# Altium footprint library ic.PcbLib: 129 footprints (part 4 of 9)
Each footprint in its own frame and in the unit in brackets; x right, y up, seen from the top. Pads: shape width x height; smd on the part's side, far side on the other; paste and mask are expansions set on the pad; w line width, h text height; cw(c..) or ccw(c..) is an arc to the next point about the centre after c.
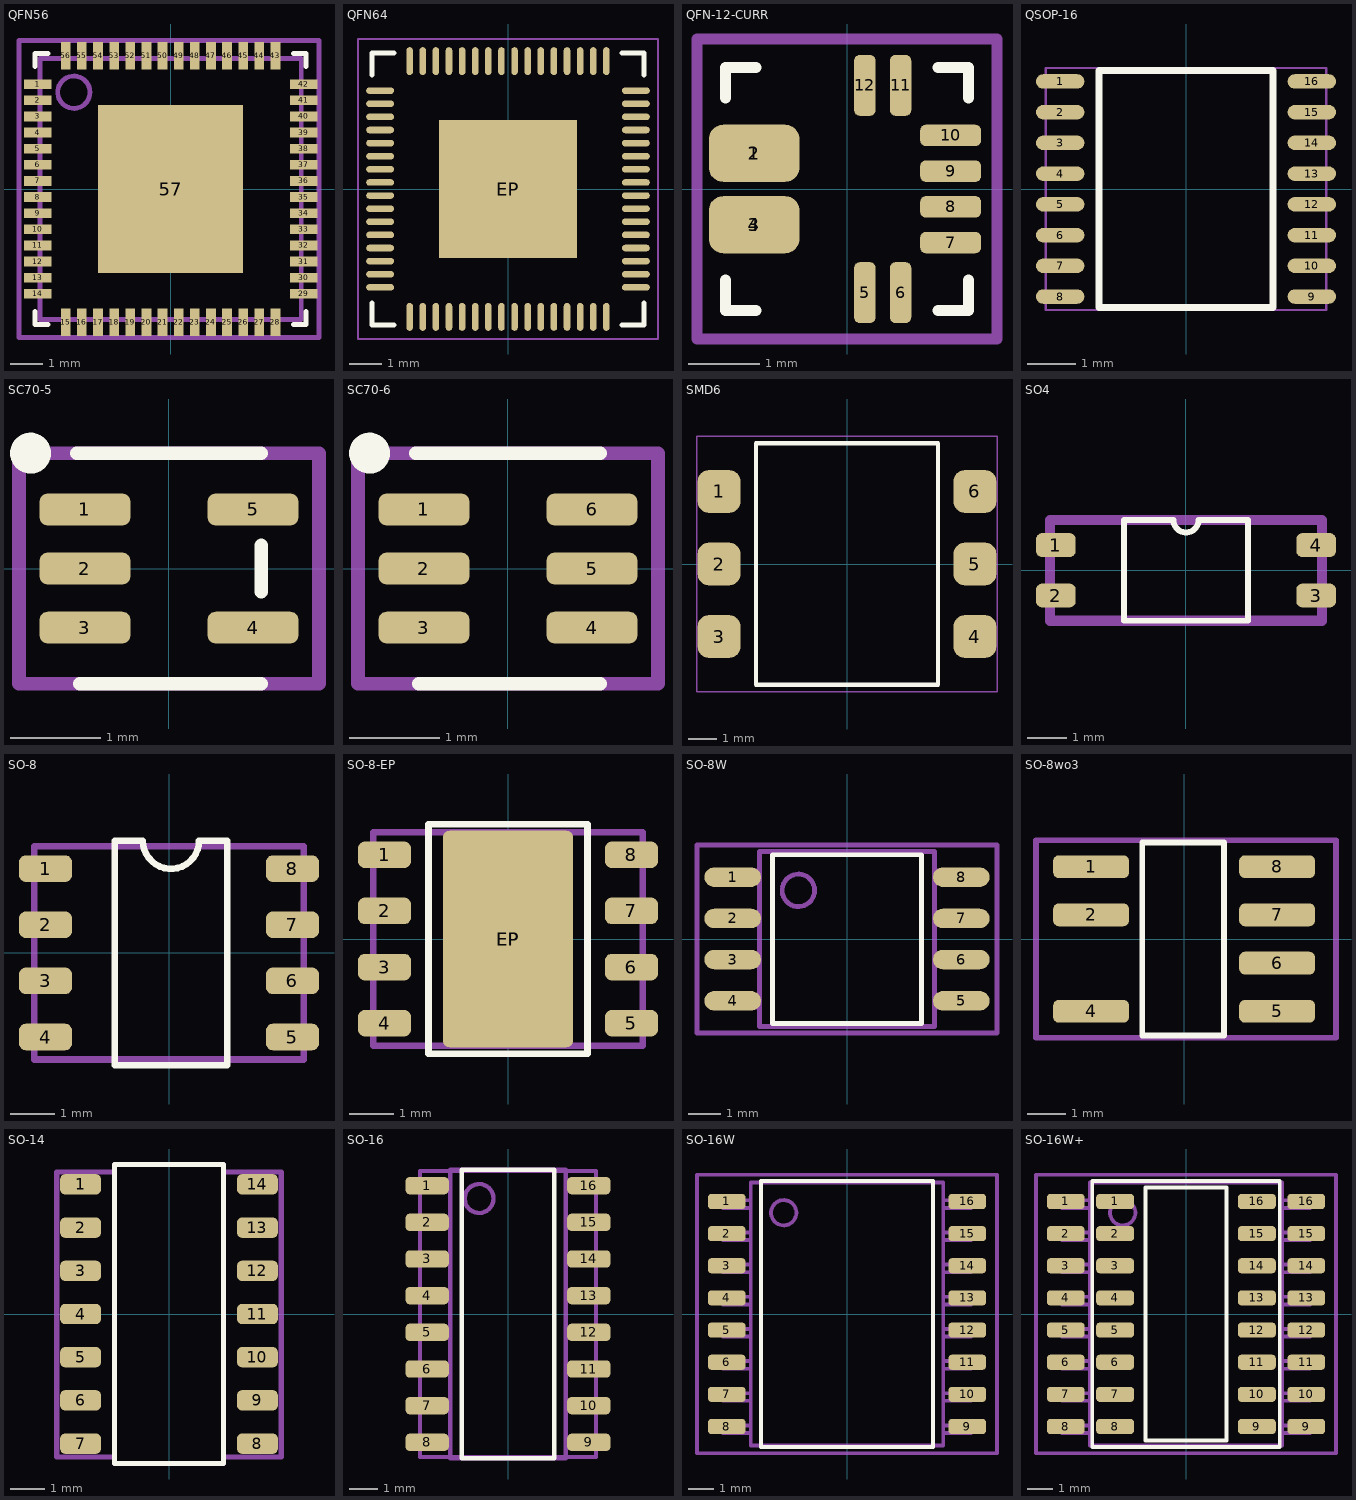
[diagram p3: the footprints below, top view; thin cyan lines are the x and y axes]

## QFN56 [mm] "QFN, 56-Leads, Body 8,00x8,00mm, Pitch 0,50mm, Thermal Pad 4,50x5,20mm, IPC Medium Density"
height 1
pads (57):
  rect 0.85x0.3 smd: 1(-4.125,3.25) 2(-4.125,2.75) 3(-4.125,2.25) 4(-4.125,1.75) 5(-4.125,1.25) 6(-4.125,0.75) 7(-4.125,0.25) 8(-4.125,-0.25) 9(-4.125,-0.75) 10(-4.125,-1.25) 11(-4.125,-1.75) 12(-4.125,-2.25) 13(-4.125,-2.75) 14(-4.125,-3.25) 29(4.125,-3.25) 30(4.125,-2.75) 31(4.125,-2.25) 32(4.125,-1.75) 33(4.125,-1.25) 34(4.125,-0.75) 35(4.125,-0.25) 36(4.125,0.25) 37(4.125,0.75) 38(4.125,1.25) 39(4.125,1.75) 40(4.125,2.25) 41(4.125,2.75) 42(4.125,3.25)
  rect 0.3x0.85 smd: 15(-3.25,-4.125) 16(-2.75,-4.125) 17(-2.25,-4.125) 18(-1.75,-4.125) 19(-1.25,-4.125) 20(-0.75,-4.125) 21(-0.25,-4.125) 22(0.25,-4.125) 23(0.75,-4.125) 24(1.25,-4.125) 25(1.75,-4.125) 26(2.25,-4.125) 27(2.75,-4.125) 28(3.25,-4.125) 43(3.25,4.125) 44(2.75,4.125) 45(2.25,4.125) 46(1.75,4.125) 47(1.25,4.125) 48(0.75,4.125) 49(0.25,4.125) 50(-0.25,4.125) 51(-0.75,4.125) 52(-1.25,4.125) 53(-1.75,4.125) 54(-2.25,4.125) 55(-2.75,4.125) 56(-3.25,4.125)
  rect 4.5x5.2 smd: 57(0,0)
Top Overlay:
  lines w0.15: -4.2,-3.8 -4.2,-4.2 -3.8,-4.2 ; -4.2,3.8 -4.2,4.2 -3.8,4.2 ; 3.8,-4.2 4.2,-4.2 4.2,-3.8 ; 3.8,4.2 4.2,4.2 4.2,3.8
  text "." at -4.761,3.935 h0.1
Top Courtyard:
  lines w0.15: -0.5,0 0.5,0 ; -4.7,-4.6 -4.7,4.6 4.6,4.6 4.6,-4.6 -4.7,-4.6
Mechanical 29:
  circle w0.15: c-3,3 r0.5
  lines w0.15: -4.05,-4.05 -4.05,4.05 4.05,4.05 4.05,-4.05 -4.05,-4.05
  text ".Designator" at -3.5,-0.4 h1

## QFN64 [mm] "QFN, 64-Leads, Body 8,00x8,00mm, Pitch 0,40mm, Thermal Pad 4,20x4,20mm, IPC Medium Density"
height 0.85
pads (65):
  oval 0.85x0.2 smd: 1(-3.9,3) 2(-3.9,2.6) 3(-3.9,2.2) 4(-3.9,1.8) 5(-3.9,1.4) 6(-3.9,1) 7(-3.9,0.6) 8(-3.9,0.2) 9(-3.9,-0.2) 10(-3.9,-0.6) 11(-3.9,-1) 12(-3.9,-1.4) 13(-3.9,-1.8) 14(-3.9,-2.2) 15(-3.9,-2.6) 16(-3.9,-3) 33(3.9,-3) 34(3.9,-2.6) 35(3.9,-2.2) 36(3.9,-1.8) 37(3.9,-1.4) 38(3.9,-1) 39(3.9,-0.6) 40(3.9,-0.2) 41(3.9,0.2) 42(3.9,0.6) 43(3.9,1) 44(3.9,1.4) 45(3.9,1.8) 46(3.9,2.2) 47(3.9,2.6) 48(3.9,3)
  oval 0.2x0.85 smd: 17(-3,-3.9) 18(-2.6,-3.9) 19(-2.2,-3.9) 20(-1.8,-3.9) 21(-1.4,-3.9) 22(-1,-3.9) 23(-0.6,-3.9) 24(-0.2,-3.9) 25(0.2,-3.9) 26(0.6,-3.9) 27(1,-3.9) 28(1.4,-3.9) 29(1.8,-3.9) 30(2.2,-3.9) 31(2.6,-3.9) 32(3,-3.9) 49(3,3.9) 50(2.6,3.9) 51(2.2,3.9) 52(1.8,3.9) 53(1.4,3.9) 54(1,3.9) 55(0.6,3.9) 56(0.2,3.9) 57(-0.2,3.9) 58(-0.6,3.9) 59(-1,3.9) 60(-1.4,3.9) 61(-1.8,3.9) 62(-2.2,3.9) 63(-2.6,3.9) 64(-3,3.9)
  rect 4.2x4.2 smd: EP(0,0)
Top Overlay:
  lines w0.15: -4.15,-3.475 -4.15,-4.15 -3.475,-4.15 ; -4.15,3.475 -4.15,4.15 -3.475,4.15 ; 3.475,-4.15 4.15,-4.15 4.15,-3.475 ; 3.475,4.15 4.15,4.15 4.15,3.475
  text "." at -4.9,3.9 h0.1
Top Courtyard:
  lines w0.05: -4.575,-4.575 4.575,-4.575 4.575,4.575 -4.575,4.575 -4.575,-4.575
  lines w0.1: -0.5,0 0.5,0 ; 0,-0.5 0,0.5
3D body "QFN64.step": height 0.85, standoff 0, extent -4.01,-4.01 4.01,4.01

## QFN-12-CURR [mm] "QFN, 12-Contact  With Fused Sensed Current Loop"
height 0.9
pads (12):
  rrect50% 1.27x0.8 smd: 1(-1.3,0.5) 2(-1.3,0.5) 3(-1.3,-0.5) 4(-1.3,-0.5)
  rrect50% 0.3x0.85 smd: 5(0.25,-1.45) 6(0.75,-1.45) 11(0.75,1.45) 12(0.25,1.45)
  rrect50% 0.85x0.3 smd: 7(1.45,-0.75) 8(1.45,-0.25) 9(1.45,0.25) 10(1.45,0.75)
Top Overlay:
  lines w0.15: -1.7,-1.275 -1.7,-1.7 -1.275,-1.7 ; -1.7,1.275 -1.7,1.7 -1.275,1.7 ; 1.275,-1.7 1.7,-1.7 1.7,-1.275 ; 1.275,1.7 1.7,1.7 1.7,1.275
  text "." at -2.2,1.575 h0.1
Top Courtyard:
  lines w0.15: -2.1,-2.1 -2.1,2.1 2.1,2.1 2.1,-2.1 -2.1,-2.1
3D body "QFN16.STEP": height 0.89, standoff 0, extent -1.55,-1.55 1.55,1.55

## QSOP-16 [mm] "QSOP, 16-Leads, Body 4,89x3,90mm, Pitch 0,64mm, IPC High Density"
height 1.75
pads (16):
  oval 1x0.3 smd: 1(-2.6,2.222) 2(-2.6,1.587) 3(-2.6,0.953) 4(-2.6,0.318) 5(-2.6,-0.318) 6(-2.6,-0.953) 7(-2.6,-1.587) 8(-2.6,-2.222) 9(2.6,-2.222) 10(2.6,-1.587) 11(2.6,-0.953) 12(2.6,-0.318) 13(2.6,0.318) 14(2.6,0.953) 15(2.6,1.587) 16(2.6,2.222)
Top Overlay:
  lines w0.15: -1.8,-2.45 -1.8,2.45 1.8,2.45 1.8,-2.45 -1.8,-2.45
  text "." at -2.655,2.859 h0.1
Top Courtyard:
  lines w0.05: -2.9,-2.5 -2.9,2.5 2.9,2.5 2.9,-2.5 -2.9,-2.5
3D body: height 1.75, standoff 0.2, extent 0,0 0,0
3D body: height 1, standoff 0.2, extent -2,-2.5 2,2.5

## SC70-5 [mm] "SOTFL, 5-Leads, Body 2,00x2,10mm, Pitch 1,30mm, IPC Medium Density"
height 1.1
pads (5):
  rrect50% 1x0.35 smd: 1(-0.925,0.65) 2(-0.925,0) 3(-0.925,-0.65) 4(0.925,-0.65) 5(0.925,0.65)
Top Overlay:
  circle w0.25: c-1.524,1.27 r0.1
  lines w0.15: -1.016,1.27 1.016,1.27 ; -0.984,-1.27 1.016,-1.27 ; 1.016,-0.254 1.016,0.254
Top Courtyard:
  lines w0.15: -1.651,-1.27 -1.651,1.27 1.651,1.27 1.651,-1.27 -1.651,-1.27
3D body: height 1.1, standoff 0, extent -1,-1.143 1,1.143

## SC70-6 [mm] "SOTFL, 6-Leads, Body 2,00x2,10mm, Pitch 1,30mm, IPC Medium Density"
height 1.1
pads (6):
  rrect50% 1x0.35 smd: 1(-0.925,0.65) 2(-0.925,0) 3(-0.925,-0.65) 4(0.925,-0.65) 5(0.925,0) 6(0.925,0.65)
Top Overlay:
  circle w0.25: c-1.524,1.27 r0.1
  lines w0.15: -1.016,1.27 1.016,1.27 ; -0.984,-1.27 1.016,-1.27
Top Courtyard:
  lines w0.15: -1.651,-1.27 -1.651,1.27 1.651,1.27 1.651,-1.27 -1.651,-1.27
3D body: height 1.1, standoff 0, extent -1,-1.143 1,1.143

## SMD6 [mm] "SMD-6, 6-Leads, Body 8,50x9,20mm, Pitch 2,55mm, IPC Medium Density"
height 4.8
pads (6):
  rrect50% 1.5x1.5 smd: 1(-4.5,2.55) 2(-4.5,0) 3(-4.5,-2.55) 4(4.5,-2.55) 5(4.5,0) 6(4.5,2.55)
Top Overlay:
  lines w0.15: -3.2,-4.25 -3.2,4.25 3.2,4.25 3.2,-4.25 -3.2,-4.25
  text "." at -4.65,4.135 h0.1
Top Courtyard:
  lines w0.05: -5.275,-4.5 5.275,-4.5 5.275,4.5 -5.275,4.5 -5.275,-4.5
3D body "SMD-6.step": height 4.8, standoff 0, extent -4.6,-4.25 4.6,4.25

## SO4 [mm]
pads (4):
  rrect50% 1x0.6 smd: 1(-3.277,0.635) 2(-3.277,-0.635) 3(3.277,-0.635) 4(3.277,0.635)
Top Overlay:
  lines w0.15: -1.565,-1.27 1.565,-1.27 1.565,1.27 0.318,1.27 cw(c0,1.27) -0.318,1.27 -1.565,1.27 -1.565,-1.27
  text "." at -3.15,1.435 h0.1
Top Courtyard:
  lines w0.254: -3.429,-1.27 -3.429,1.27 3.429,1.27 3.429,-1.27 -3.429,-1.27
3D body "PC3H7.STEP": height 2.1, standoff 0.05, extent -3.5,-1.3 3.5,1.3

## SO-8 [mm]
pads (8):
  rrect50% 1.2x0.6 smd: 1(-2.794,1.905) 2(-2.794,0.635) 3(-2.794,-0.635) 4(-2.794,-1.905) 5(2.794,-1.905) 6(2.794,-0.635) 7(2.794,0.635) 8(2.794,1.905)
Top Overlay:
  lines w0.15: -1.226,-2.545 1.314,-2.545 1.314,2.535 0.679,2.535 cw(c0.044,2.535) -0.591,2.535 -1.226,2.535 -1.226,-2.545
  text "." at -2.7,2.8 h0.1
Top Courtyard:
  lines w0.15: -3.048,-2.413 3.048,-2.413 3.048,2.413 -3.048,2.413 -3.048,-2.413
3D body "User Library-so8-4.STEP": height 1.76, standoff 0, extent -3.068,-2.445 3.068,2.445

## SO-8-EP [mm]
pads (10):
  rrect50% 1.2x0.6 smd: 1(-2.794,1.905) 2(-2.794,0.635) 3(-2.794,-0.635) 4(-2.794,-1.905) 5(2.794,-1.905) 6(2.794,-0.635) 7(2.794,0.635) 8(2.794,1.905)
  rrect10% 2.95x4.9 smd mask+0.102: EP(0,0)
  rrect10% 2.6x3.1 smd: EP(0,0)
Top Overlay:
  lines w0.15: 1.8,2.596 -1.8,2.596 -1.8,-2.6 1.8,-2.6 1.8,2.6
  text "." at -2.7,2.8 h0.1
Top Courtyard:
  lines w0.15: -3.048,-2.413 3.048,-2.413 3.048,2.413 -3.048,2.413 -3.048,-2.413
3D body "User Library-so8-4.STEP": height 1.76, standoff 0, extent -3.068,-2.445 3.068,2.445

## SO-8W [mm] "SOIC, 8-Leads, Body 5,28x5,28mm, Pitch 1,27mm, IPC Medium Density"
height 1.91
pads (8):
  oval 1.75x0.6 smd: 1(-3.525,1.905) 2(-3.525,0.635) 3(-3.525,-0.635) 4(-3.525,-1.905) 5(3.525,-1.905) 6(3.525,-0.635) 7(3.525,0.635) 8(3.525,1.905)
Top Overlay:
  lines w0.15: -2.3,-2.6 2.3,-2.6 2.3,2.596 -2.3,2.596 -2.3,-2.6
  text "." at -4,2.7 h0.1
Top Courtyard:
  lines w0.15: -4.625,-2.9 4.625,-2.9 4.625,2.9 -4.625,2.9 -4.625,-2.9
Mechanical 29:
  circle w0.15: c-1.5,1.5 r0.5
  lines w0.15: -2.7,-2.1 -3.8,-2.1 -3.8,-1.8 -2.7,-1.8 ; -2.7,-0.8 -3.8,-0.8 -3.8,-0.5 -2.7,-0.5 ; -2.7,0.5 -3.8,0.5 -3.8,0.8 -2.7,0.8 ; -2.7,1.8 -3.8,1.8 -3.8,2.1 -2.7,2.1 ; 2.7,-2.1 3.8,-2.1 3.8,-1.8 2.7,-1.8 ; 2.7,-0.8 3.8,-0.8 3.8,-0.5 2.7,-0.5 ; 2.7,0.5 3.8,0.5 3.8,0.8 2.7,0.8 ; 2.7,1.8 3.8,1.8 3.8,2.1 2.7,2.1 ; -2.7,-2.7 -2.7,2.7 2.7,2.7 2.7,-2.7 -2.7,-2.7
  text ".Designator" at -2.5,-0.5 h1
3D body: height 1.91, standoff 0.1, extent -2.65,-2.65 2.65,2.65

## SO-8wo3 [mm]
pads (7):
  rrect50% 2x0.6 smd: 1(-2.45,1.905) 2(-2.45,0.635) 4(-2.45,-1.905) 5(2.45,-1.905) 6(2.45,-0.635) 7(2.45,0.635) 8(2.45,1.905)
Top Overlay:
  lines w0.15: -1.1,2.539 1.05,2.539 ; -1.1,2.54 -1.1,-2.54 1.05,-2.54 1.05,2.54
  text "." at -2.5,2.6 h0.1
Top Courtyard:
  lines w0.15: -3.9,-2.6 -3.9,2.6 4,2.6 4,-2.6 -3.9,-2.6
3D body "User Library-so8-4.STEP": height 1.76, standoff 0, extent -3.099,-2.445 3.038,2.445

## SO-14 [mm] "SOIC, 14-Leads, Body 8,65x3,90mm, Pitch 1,27mm, IPC Medium Density"
height 1.75
pads (14):
  rrect50% 1.2x0.6 smd: 1(-2.6,3.81) 2(-2.6,2.54) 3(-2.6,1.27) 4(-2.6,0) 5(-2.6,-1.27) 6(-2.6,-2.54) 7(-2.6,-3.81) 8(2.6,-3.81) 9(2.6,-2.54) 10(2.6,-1.27) 11(2.6,0) 12(2.6,1.27) 13(2.6,2.54) 14(2.6,3.81)
Top Overlay:
  lines w0.15: -1.6,-4.4 -1.6,4.4 1.6,4.4 1.6,-4.4 -1.6,-4.4
  text "." at -3.2,4.7 h0.1
Top Courtyard:
  lines w0.15: -3.3,-4.2 -1.6,-4.2 -1.6,-4.4 1.6,-4.4 1.6,-4.2 3.3,-4.2 3.3,4.173 1.6,4.173 1.6,4.4 -1.6,4.4 -1.6,4.18 -3.3,4.18 -3.3,-4.2
3D body "SO-14N.step": height 1.75, standoff 0, extent -3,-4.4 3,4.4

## SO-16 [mm] "SOIC, 16-Leads, Body 9,90x3,90mm, Pitch 1,27mm, IPC Medium Density"
height 1.26
pads (16):
  rrect50% 1.5x0.6 smd: 1(-2.8,4.445) 2(-2.8,3.175) 3(-2.8,1.905) 4(-2.8,0.635) 5(-2.8,-0.635) 6(-2.8,-1.905) 7(-2.8,-3.175) 8(-2.8,-4.445) 9(2.8,-4.445) 10(2.8,-3.175) 11(2.8,-1.905) 12(2.8,-0.635) 13(2.8,0.635) 14(2.8,1.905) 15(2.8,3.175) 16(2.8,4.445)
Top Overlay:
  lines w0.15: -1.6,-5 -1.6,5 1.6,5 1.6,-5 -1.6,-5
  text "." at -3.2,5.3 h0.1
Top Courtyard:
  lines w0.15: -3.048,-4.953 -3.048,4.953 3.048,4.953 3.048,-4.953 -3.048,-4.953
Mechanical 29:
  circle w0.15: c-1,4 r0.5
  lines w0.15: -2,-4.6 -3.1,-4.6 -3.1,-4.3 -2,-4.3 ; -2,-3.33 -3.1,-3.33 -3.1,-3.03 -2,-3.03 ; -2,-2.06 -3.1,-2.06 -3.1,-1.76 -2,-1.76 ; -2,-0.79 -3.1,-0.79 -3.1,-0.49 -2,-0.49 ; -2,0.48 -3.1,0.48 -3.1,0.78 -2,0.78 ; -2,1.75 -3.1,1.75 -3.1,2.05 -2,2.05 ; -2,3.02 -3.1,3.02 -3.1,3.32 -2,3.32 ; -2,4.29 -3.1,4.29 -3.1,4.59 -2,4.59 ; 2,-4.6 3.1,-4.6 3.1,-4.3 2,-4.3 ; 2,-3.33 3.1,-3.33 3.1,-3.03 2,-3.03 ; 2,-2.06 3.1,-2.06 3.1,-1.76 2,-1.76 ; 2,-0.79 3.1,-0.79 3.1,-0.49 2,-0.49 ; 2,0.48 3.1,0.48 3.1,0.78 2,0.78 ; 2,1.75 3.1,1.75 3.1,2.05 2,2.05 ; 2,3.02 3.1,3.02 3.1,3.32 2,3.32 ; 2,4.29 3.1,4.29 3.1,4.59 2,4.59 ; -2,-5 -2,5 2,5 2,-5 -2,-5
  text ".Designator" at -1.9,-0.3 h1
3D body "SO-16.step": height 1.75, standoff 0, extent -3,-5 3,5

## SO-16W [mm] "SOIC, 16-Leads, Body 10,30x7,50mm, Pitch 1,27mm, IPC Medium Density"
height 2.65
pads (16):
  rrect50% 1.5x0.6 smd: 1(-4.75,4.445) 2(-4.75,3.175) 3(-4.75,1.905) 4(-4.75,0.635) 5(-4.75,-0.635) 6(-4.75,-1.905) 7(-4.75,-3.175) 8(-4.75,-4.445) 9(4.75,-4.445) 10(4.75,-3.175) 11(4.75,-1.905) 12(4.75,-0.635) 13(4.75,0.635) 14(4.75,1.905) 15(4.75,3.175) 16(4.75,4.445)
Top Overlay:
  lines w0.15: -3.4,-5.25 3.4,-5.25 3.4,5.25 -3.4,5.25 -3.4,-5.25
  text "." at -5.5,5.4 h0.1
Top Courtyard:
  lines w0.15: -5.925,-5.5 5.925,-5.5 5.925,5.5 -5.925,5.5 -5.925,-5.5
Mechanical 29:
  circle w0.15: c-2.5,4 r0.5
  lines w0.15: -3.8,-4.7 -4.9,-4.7 -4.9,-4.4 -3.8,-4.4 ; -3.8,-3.43 -4.9,-3.43 -4.9,-3.13 -3.8,-3.13 ; -3.8,-2.16 -4.9,-2.16 -4.9,-1.86 -3.8,-1.86 ; -3.8,-0.89 -4.9,-0.89 -4.9,-0.59 -3.8,-0.59 ; -3.8,0.38 -4.9,0.38 -4.9,0.68 -3.8,0.68 ; -3.8,1.65 -4.9,1.65 -4.9,1.95 -3.8,1.95 ; -3.8,2.92 -4.9,2.92 -4.9,3.22 -3.8,3.22 ; -3.8,4.19 -4.9,4.19 -4.9,4.49 -3.8,4.49 ; 3.8,-4.7 4.9,-4.7 4.9,-4.4 3.8,-4.4 ; 3.8,-3.43 4.9,-3.43 4.9,-3.13 3.8,-3.13 ; 3.8,-2.16 4.9,-2.16 4.9,-1.86 3.8,-1.86 ; 3.8,-0.89 4.9,-0.89 4.9,-0.59 3.8,-0.59 ; 3.8,0.38 4.9,0.38 4.9,0.68 3.8,0.68 ; 3.8,1.65 4.9,1.65 4.9,1.95 3.8,1.95 ; 3.8,2.92 4.9,2.92 4.9,3.22 3.8,3.22 ; 3.8,4.19 4.9,4.19 4.9,4.49 3.8,4.49 ; -3.8,-5.2 -3.8,5.2 3.8,5.2 3.8,-5.2 -3.8,-5.2
  text ".Designator" at -3.3,-0.3 h1
3D body "SOIC16W.step": height 2.65, standoff 0, extent -5.162,-5.25 5.162,5.25

## SO-16W+ [mm] "SOIC, 16-Leads, Body 10,30x7,50mm, Pitch 1,27mm, IPC Medium Density"
height 2.65
pads (32):
  rrect50% 1.5x0.6 smd: 1(-4.75,4.445) 1(-2.8,4.445) 2(-4.75,3.175) 2(-2.8,3.175) 3(-4.75,1.905) 3(-2.8,1.905) 4(-4.75,0.635) 4(-2.8,0.635) 5(-4.75,-0.635) 5(-2.8,-0.635) 6(-4.75,-1.905) 6(-2.8,-1.905) 7(-4.75,-3.175) 7(-2.8,-3.175) 8(-4.75,-4.445) 8(-2.8,-4.445) 9(2.8,-4.445) 9(4.75,-4.445) 10(2.8,-3.175) 10(4.75,-3.175) 11(2.8,-1.905) 11(4.75,-1.905) 12(2.8,-0.635) 12(4.75,-0.635) 13(2.8,0.635) 13(4.75,0.635) 14(2.8,1.905) 14(4.75,1.905) 15(2.8,3.175) 15(4.75,3.175) 16(2.8,4.445) 16(4.75,4.445)
Top Overlay:
  lines w0.15: -3.7,-5.25 -3.7,5.25 3.7,5.25 3.7,-5.25 -3.7,-5.25 ; -1.6,-5 1.6,-5 1.6,5 -1.6,5 -1.6,-5
  text "." at -5.5,5.4 h0.1
Top Courtyard:
  lines w0.15: -5.925,-5.5 -5.925,5.5 5.925,5.5 5.925,-5.5 -5.925,-5.5
Mechanical 29:
  circle w0.15: c-2.5,4 r0.5
  lines w0.15: -3.8,-4.7 -4.9,-4.7 -4.9,-4.4 -3.8,-4.4 ; -3.8,-3.43 -4.9,-3.43 -4.9,-3.13 -3.8,-3.13 ; -3.8,-2.16 -4.9,-2.16 -4.9,-1.86 -3.8,-1.86 ; -3.8,-0.89 -4.9,-0.89 -4.9,-0.59 -3.8,-0.59 ; -3.8,0.38 -4.9,0.38 -4.9,0.68 -3.8,0.68 ; -3.8,1.65 -4.9,1.65 -4.9,1.95 -3.8,1.95 ; -3.8,2.92 -4.9,2.92 -4.9,3.22 -3.8,3.22 ; -3.8,4.19 -4.9,4.19 -4.9,4.49 -3.8,4.49 ; 3.8,-4.7 4.9,-4.7 4.9,-4.4 3.8,-4.4 ; 3.8,-3.43 4.9,-3.43 4.9,-3.13 3.8,-3.13 ; 3.8,-2.16 4.9,-2.16 4.9,-1.86 3.8,-1.86 ; 3.8,-0.89 4.9,-0.89 4.9,-0.59 3.8,-0.59 ; 3.8,0.38 4.9,0.38 4.9,0.68 3.8,0.68 ; 3.8,1.65 4.9,1.65 4.9,1.95 3.8,1.95 ; 3.8,2.92 4.9,2.92 4.9,3.22 3.8,3.22 ; 3.8,4.19 4.9,4.19 4.9,4.49 3.8,4.49 ; -3.8,-5.2 3.8,-5.2 3.8,5.2 -3.8,5.2 -3.8,-5.2
  text ".Designator" at -3.3,-0.3 h1
3D body "SOIC16W.step": height 2.65, standoff 0, extent -5.162,-5.25 5.162,5.25